# Altium integrated library Lattice CPLD ispLSI.IntLib: 471 symbols (part 2 of 26)
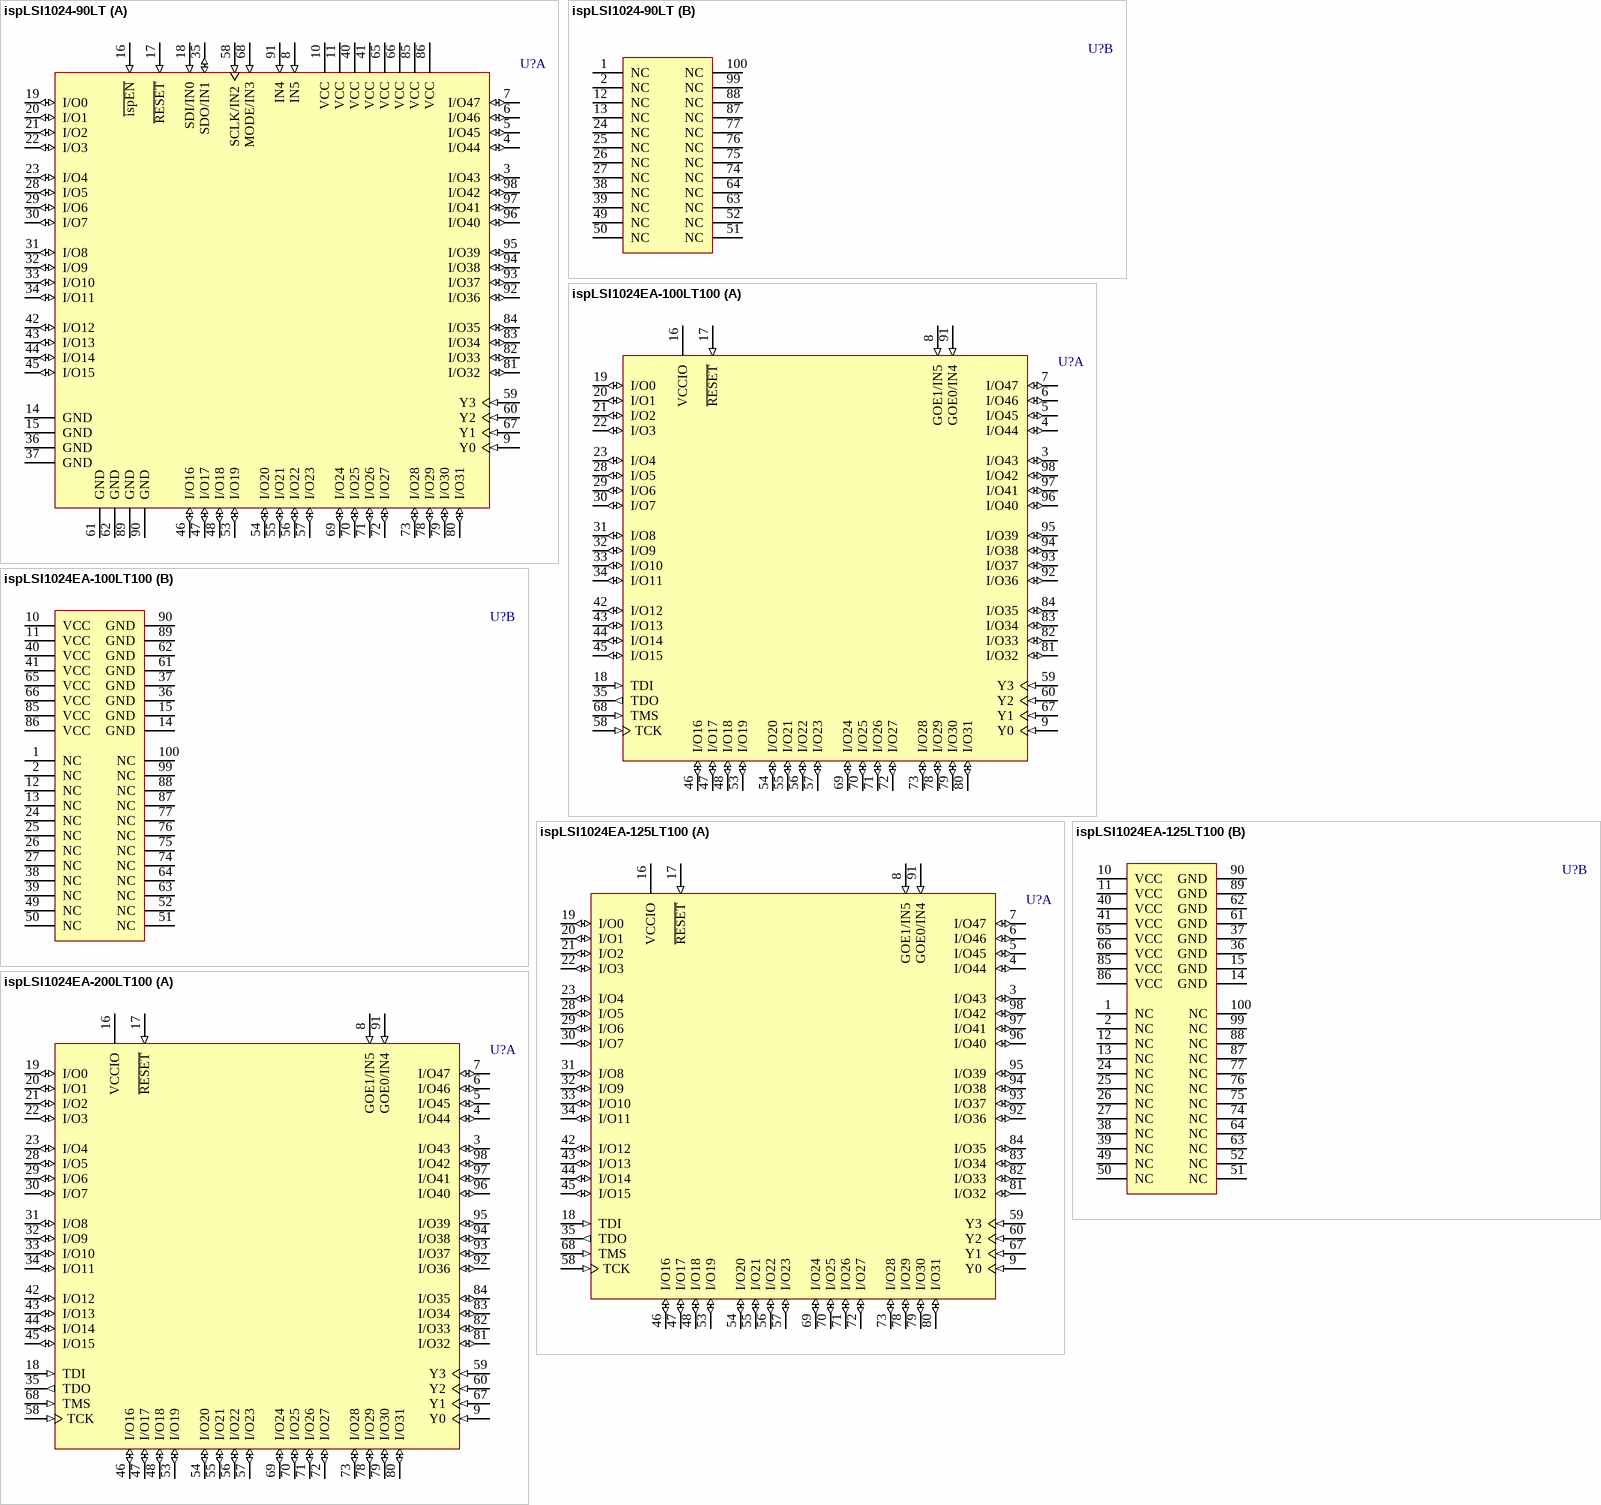
[diagram p232: symbols ispLSI1024-90LT to ispLSI1024EA-200LT100]

## ispLSI1024EA-100LT100
designator U?
In-System Programmable High-Density PLD; Note: Pins 8 and 91 have dual function capability which is software selectable.; Published: 23-Sep-2002; LatestRevisionDate: 13-Apr-2006; LatestRevisionNote: IPC-7351 Footprint Added.; DatasheetVersion: Jun-2000; PackageVersion: pkg_32, Aug-2005; PackageReference: TQFP100; Publisher: Altium Limited; PackageDescription: 100-Pin Thin Quad Flat Pack (TQFP100); Code_JEDEC: MS-026-BED; ComponentLink1Description: Manufacturer Link; ComponentLink1URL: http://www.latticesemi.com/products/mature/index.cfm; ComponentLink2Description: Datasheet; ComponentLink2URL: http://www.latticesemi.com/lit/docs/datasheets/cpld/1024ea.pdf
footprint TQFP100_N (Thin QFP, 100-Leads, Body 14x14mm, Pitch 0.5mm, IPC Medium Density)
footprint TQFP100_L (Thin QFP, 100-Leads, Body 14x14mm, Pitch 0.5mm, IPC High Density)
footprint TQFP100_M (Thin QFP, 100-Leads, Body 14x14mm, Pitch 0.5mm, IPC Low Density)
3D model 1024EA-TQFP100 (100-Pin Thin Quad Flat Pack (TQFP100))
part A pins: 3 I/O43 (io), 4 I/O44 (io), 5 I/O45 (io), 6 I/O46 (io), 7 I/O47 (io), 8 GOE1/IN5 (in), 9 Y0 (in), 16 VCCIO (power), 17 ~{RESET} (in), 18 TDI (in), 19 I/O0 (io), 20 I/O1 (io), 21 I/O2 (io), 22 I/O3 (io), 23 I/O4 (io), 28 I/O5 (io), 29 I/O6 (io), 30 I/O7 (io), 31 I/O8 (io), 32 I/O9 (io), 33 I/O10 (io), 34 I/O11 (io), 35 TDO (out), 42 I/O12 (io), 43 I/O13 (io), 44 I/O14 (io), 45 I/O15 (io), 46 I/O16 (io), 47 I/O17 (io), 48 I/O18 (io), 53 I/O19 (io), 54 I/O20 (io), 55 I/O21 (io), 56 I/O22 (io), 57 I/O23 (io), 58 TCK (in), 59 Y3 (in), 60 Y2 (in), 67 Y1 (in), 68 TMS (in), 69 I/O24 (io), 70 I/O25 (io), 71 I/O26 (io), 72 I/O27 (io), 73 I/O28 (io), 78 I/O29 (io), 79 I/O30 (io), 80 I/O31 (io), 81 I/O32 (io), 82 I/O33 (io), 83 I/O34 (io), 84 I/O35 (io), 91 GOE0/IN4 (in), 92 I/O36 (io), 93 I/O37 (io), 94 I/O38 (io), 95 I/O39 (io), 96 I/O40 (io), 97 I/O41 (io), 98 I/O42 (io)
part B pins: 1 NC, 2 NC, 10 VCC (power), 11 VCC (power), 12 NC, 13 NC, 14 GND (power), 15 GND (power), 24 NC, 25 NC, 26 NC, 27 NC, 36 GND (power), 37 GND (power), 38 NC, 39 NC, 40 VCC (power), 41 VCC (power), 49 NC, 50 NC, 51 NC, 52 NC, 61 GND (power), 62 GND (power), 63 NC, 64 NC, 65 VCC (power), 66 VCC (power), 74 NC, 75 NC, 76 NC, 77 NC, 85 VCC (power), 86 VCC (power), 87 NC, 88 NC, 89 GND (power), 90 GND (power), 99 NC, 100 NC

## ispLSI1024EA-125LT100
designator U?
In-System Programmable High-Density PLD; Note: Pins 8 and 91 have dual function capability which is software selectable.; Published: 23-Sep-2002; LatestRevisionDate: 13-Apr-2006; LatestRevisionNote: IPC-7351 Footprint Added.; DatasheetVersion: Jun-2000; PackageVersion: pkg_32, Aug-2005; PackageReference: TQFP100; Publisher: Altium Limited; PackageDescription: 100-Pin Thin Quad Flat Pack (TQFP100); Code_JEDEC: MS-026-BED; ComponentLink1Description: Manufacturer Link; ComponentLink1URL: http://www.latticesemi.com/products/mature/index.cfm; ComponentLink2Description: Datasheet; ComponentLink2URL: http://www.latticesemi.com/lit/docs/datasheets/cpld/1024ea.pdf
footprint TQFP100_N (Thin QFP, 100-Leads, Body 14x14mm, Pitch 0.5mm, IPC Medium Density)
footprint TQFP100_L (Thin QFP, 100-Leads, Body 14x14mm, Pitch 0.5mm, IPC High Density)
footprint TQFP100_M (Thin QFP, 100-Leads, Body 14x14mm, Pitch 0.5mm, IPC Low Density)
3D model 1024EA-TQFP100 (100-Pin Thin Quad Flat Pack (TQFP100))
part A pins: 3 I/O43 (io), 4 I/O44 (io), 5 I/O45 (io), 6 I/O46 (io), 7 I/O47 (io), 8 GOE1/IN5 (in), 9 Y0 (in), 16 VCCIO (power), 17 ~{RESET} (in), 18 TDI (in), 19 I/O0 (io), 20 I/O1 (io), 21 I/O2 (io), 22 I/O3 (io), 23 I/O4 (io), 28 I/O5 (io), 29 I/O6 (io), 30 I/O7 (io), 31 I/O8 (io), 32 I/O9 (io), 33 I/O10 (io), 34 I/O11 (io), 35 TDO (out), 42 I/O12 (io), 43 I/O13 (io), 44 I/O14 (io), 45 I/O15 (io), 46 I/O16 (io), 47 I/O17 (io), 48 I/O18 (io), 53 I/O19 (io), 54 I/O20 (io), 55 I/O21 (io), 56 I/O22 (io), 57 I/O23 (io), 58 TCK (in), 59 Y3 (in), 60 Y2 (in), 67 Y1 (in), 68 TMS (in), 69 I/O24 (io), 70 I/O25 (io), 71 I/O26 (io), 72 I/O27 (io), 73 I/O28 (io), 78 I/O29 (io), 79 I/O30 (io), 80 I/O31 (io), 81 I/O32 (io), 82 I/O33 (io), 83 I/O34 (io), 84 I/O35 (io), 91 GOE0/IN4 (in), 92 I/O36 (io), 93 I/O37 (io), 94 I/O38 (io), 95 I/O39 (io), 96 I/O40 (io), 97 I/O41 (io), 98 I/O42 (io)
part B pins: 1 NC, 2 NC, 10 VCC (power), 11 VCC (power), 12 NC, 13 NC, 14 GND (power), 15 GND (power), 24 NC, 25 NC, 26 NC, 27 NC, 36 GND (power), 37 GND (power), 38 NC, 39 NC, 40 VCC (power), 41 VCC (power), 49 NC, 50 NC, 51 NC, 52 NC, 61 GND (power), 62 GND (power), 63 NC, 64 NC, 65 VCC (power), 66 VCC (power), 74 NC, 75 NC, 76 NC, 77 NC, 85 VCC (power), 86 VCC (power), 87 NC, 88 NC, 89 GND (power), 90 GND (power), 99 NC, 100 NC

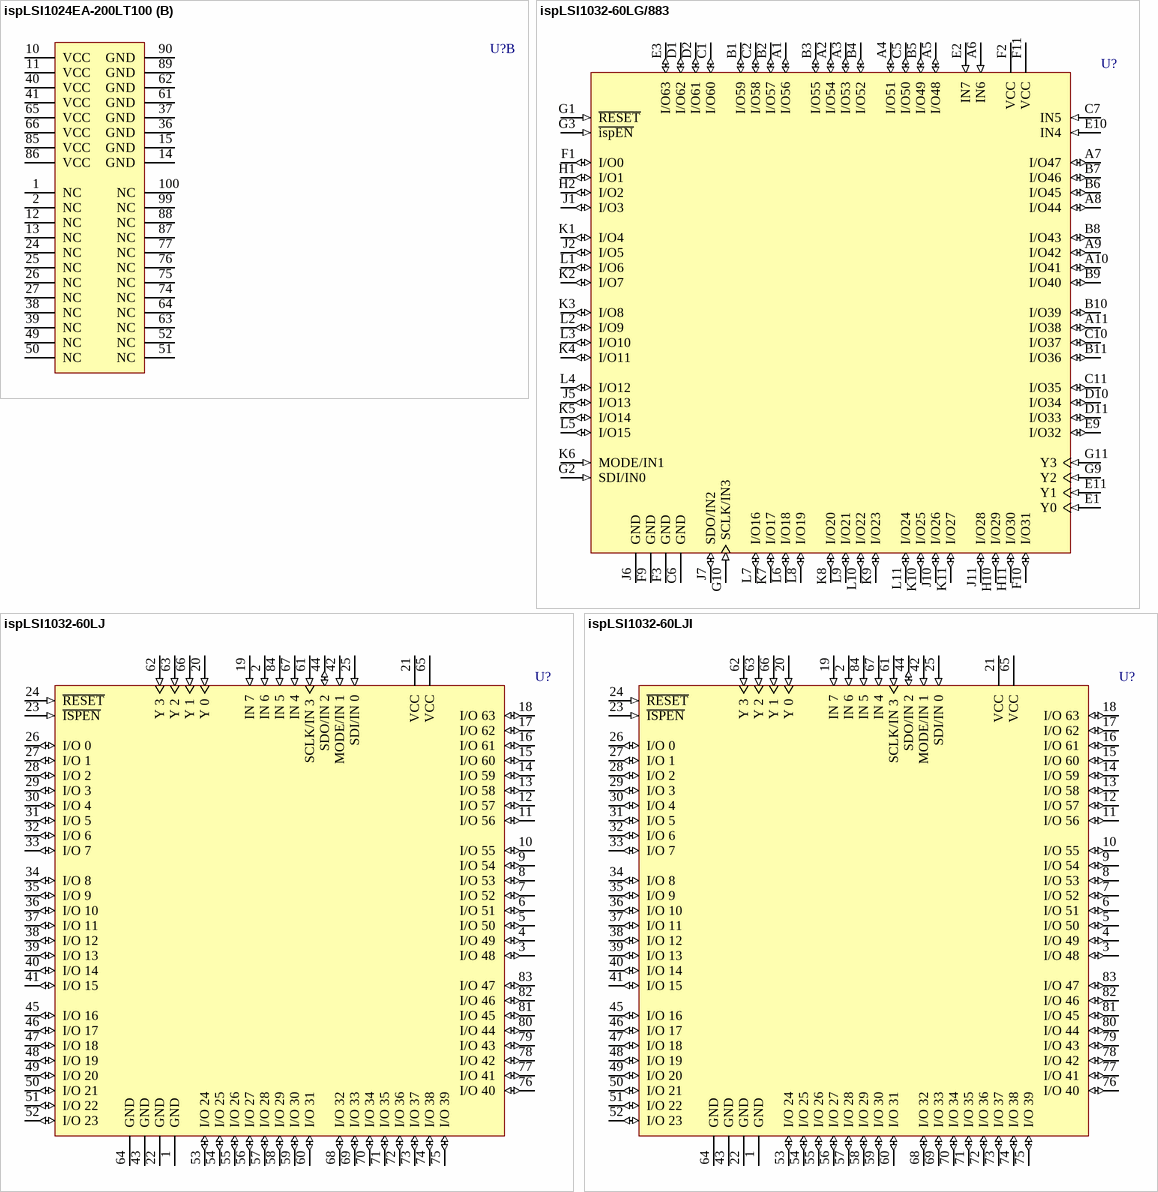
[diagram p6: symbols ispLSI1024EA-200LT100 to ispLSI1032-60LJI]

## ispLSI1024EA-200LT100
designator U?
In-System Programmable High-Density PLD; Note: Pins 8 and 91 have dual function capability which is software selectable.; Published: 23-Sep-2002; LatestRevisionDate: 13-Apr-2006; LatestRevisionNote: IPC-7351 Footprint Added.; DatasheetVersion: Jun-2000; PackageVersion: pkg_32, Aug-2005; PackageReference: TQFP100; Publisher: Altium Limited; PackageDescription: 100-Pin Thin Quad Flat Pack (TQFP100); Code_JEDEC: MS-026-BED; ComponentLink1Description: Manufacturer Link; ComponentLink1URL: http://www.latticesemi.com/products/mature/index.cfm; ComponentLink2Description: Datasheet; ComponentLink2URL: http://www.latticesemi.com/lit/docs/datasheets/cpld/1024ea.pdf
footprint TQFP100_N (Thin QFP, 100-Leads, Body 14x14mm, Pitch 0.5mm, IPC Medium Density)
footprint TQFP100_L (Thin QFP, 100-Leads, Body 14x14mm, Pitch 0.5mm, IPC High Density)
footprint TQFP100_M (Thin QFP, 100-Leads, Body 14x14mm, Pitch 0.5mm, IPC Low Density)
3D model 1024EA-TQFP100 (100-Pin Thin Quad Flat Pack (TQFP100))
part A pins: 3 I/O43 (io), 4 I/O44 (io), 5 I/O45 (io), 6 I/O46 (io), 7 I/O47 (io), 8 GOE1/IN5 (in), 9 Y0 (in), 16 VCCIO (power), 17 ~{RESET} (in), 18 TDI (in), 19 I/O0 (io), 20 I/O1 (io), 21 I/O2 (io), 22 I/O3 (io), 23 I/O4 (io), 28 I/O5 (io), 29 I/O6 (io), 30 I/O7 (io), 31 I/O8 (io), 32 I/O9 (io), 33 I/O10 (io), 34 I/O11 (io), 35 TDO (out), 42 I/O12 (io), 43 I/O13 (io), 44 I/O14 (io), 45 I/O15 (io), 46 I/O16 (io), 47 I/O17 (io), 48 I/O18 (io), 53 I/O19 (io), 54 I/O20 (io), 55 I/O21 (io), 56 I/O22 (io), 57 I/O23 (io), 58 TCK (in), 59 Y3 (in), 60 Y2 (in), 67 Y1 (in), 68 TMS (in), 69 I/O24 (io), 70 I/O25 (io), 71 I/O26 (io), 72 I/O27 (io), 73 I/O28 (io), 78 I/O29 (io), 79 I/O30 (io), 80 I/O31 (io), 81 I/O32 (io), 82 I/O33 (io), 83 I/O34 (io), 84 I/O35 (io), 91 GOE0/IN4 (in), 92 I/O36 (io), 93 I/O37 (io), 94 I/O38 (io), 95 I/O39 (io), 96 I/O40 (io), 97 I/O41 (io), 98 I/O42 (io)
part B pins: 1 NC, 2 NC, 10 VCC (power), 11 VCC (power), 12 NC, 13 NC, 14 GND (power), 15 GND (power), 24 NC, 25 NC, 26 NC, 27 NC, 36 GND (power), 37 GND (power), 38 NC, 39 NC, 40 VCC (power), 41 VCC (power), 49 NC, 50 NC, 51 NC, 52 NC, 61 GND (power), 62 GND (power), 63 NC, 64 NC, 65 VCC (power), 66 VCC (power), 74 NC, 75 NC, 76 NC, 77 NC, 85 VCC (power), 86 VCC (power), 87 NC, 88 NC, 89 GND (power), 90 GND (power), 99 NC, 100 NC

## ispLSI1032-60LG/883
designator U?
In-System Programmable High-Density PLD; Note: Pins G2, K6, J7 and G10 have dual function capability.; Published: 23-Sep-2002; LatestRevisionDate: 04-Mar-2005; LatestRevisionNote: Stylized 3D Model Added.; DatasheetVersion: Mar-1999; PackageVersion: pkg_32, Aug-2005; PackageReference: CPGA84; Publisher: Altium Limited; PackageDescription: 85-Pin Pin Grid Array 2.54 mm Pitch; ComponentLink1Description: Manufacturer Link; ComponentLink1URL: http://www.latticesemi.com/products/mature/index.cfm; ComponentLink2Description: Datasheet; ComponentLink2URL: http://www.latticesemi.com/lit/docs/datasheets/cpld/1032.pdf
footprint CPGA84 (PGA, 85-Leads, Body 29.5x29.5mm, Pitch 2.54mm)
3D model 1032-CPGA84 (85-Pin Pin Grid Array 2.54 mm Pitch)
pins: A1 I/O56 (io), A2 I/O54 (io), A3 I/O53 (io), A4 I/O51 (io), A5 I/O48 (io), A6 IN6 (in), A7 I/O47 (io), A8 I/O44 (io), A9 I/O42 (io), A10 I/O41 (io), A11 I/O38 (io), B1 I/O59 (io), B2 I/O57 (io), B3 I/O55 (io), B4 I/O52 (io), B5 I/O49 (io), B6 I/O45 (io), B7 I/O46 (io), B8 I/O43 (io), B9 I/O40 (io), B10 I/O39 (io), B11 I/O36 (io), C1 I/O60 (io), C2 I/O58 (io), C5 I/O50 (io), C6 GND (power), C7 IN5 (in), C10 I/O37 (io), C11 I/O35 (io), D1 I/O62 (io), D2 I/O61 (io), D10 I/O34 (io), D11 I/O33 (io), E1 Y0 (in), E2 IN7 (in), E3 I/O63 (io), E9 I/O32 (io), E10 IN4 (in), E11 Y1 (in), F1 I/O0 (io), F2 VCC (power), F3 GND (power), F9 GND (power), F10 I/O31 (io), F11 VCC (power), G1 ~{RESET} (in), G2 SDI/IN0 (in), G3 ~{ispEN} (in), G9 Y2 (in), G10 SCLK/IN3 (in), G11 Y3 (in), H1 I/O1 (io), H2 I/O2 (io), H10 I/O29 (io), H11 I/O30 (io), J1 I/O3 (io), J2 I/O5 (io), J5 I/O13 (io), J6 GND (power), J7 SDO/IN2 (io), J10 I/O26 (io), J11 I/O28 (io), K1 I/O4 (io), K2 I/O7 (io), K3 I/O8 (io), K4 I/O11 (io), K5 I/O14 (io), K6 MODE/IN1 (in), K7 I/O17 (io), K8 I/O20 (io), K9 I/O23 (io), K10 I/O25 (io), K11 I/O27 (io), L1 I/O6 (io), L2 I/O9 (io), L3 I/O10 (io), L4 I/O12 (io), L5 I/O15 (io), L6 I/O18 (io), L7 I/O16 (io), L8 I/O19 (io), L9 I/O21 (io), L10 I/O22 (io), L11 I/O24 (io)

## ispLSI1032-60LJ
designator U?
High-Density Programmable Logic; Published: 8-Jun-2000; LatestRevisionDate: 13-Apr-2006; LatestRevisionNote: IPC-7351 Footprint Added.; DatasheetVersion: 1994; PackageVersion: pkg_32, Aug-2005; PackageReference: PLCC84; Publisher: Altium Limited; PackageDescription: 84-Pin Leaded Chip Carrier 1.27 mm Pitch; Code_IPC: PLCC-84; ComponentLink1Description: Manufacturer Link; ComponentLink1URL: http://www.latticesemi.com/products/mature/index.cfm; ComponentLink2Description: Datasheet; ComponentLink2URL: http://www.latticesemi.com/lit/docs/datasheets/cpld/1032.pdf
footprint PLCC84_N (Leaded Chip Carrier, 84-Leads, Body 29.3x29.3mm, Pitch 1.27mm, IPC Medium Density)
footprint PLCC84_L (Leaded Chip Carrier, 84-Leads, Body 29.3x29.3mm, Pitch 1.27mm, IPC High Density)
footprint PLCC84_M (Leaded Chip Carrier, 84-Leads, Body 29.3x29.3mm, Pitch 1.27mm, IPC Low Density)
3D model 1032-PLCC84 (84-Pin Leaded Chip Carrier 1.27 mm Pitch)
pins: 1 GND (power), 2 IN 6 (in), 3 I/O 48 (io), 4 I/O 49 (io), 5 I/O 50 (io), 6 I/O 51 (io), 7 I/O 52 (io), 8 I/O 53 (io), 9 I/O 54 (io), 10 I/O 55 (io), 11 I/O 56 (io), 12 I/O 57 (io), 13 I/O 58 (io), 14 I/O 59 (io), 15 I/O 60 (io), 16 I/O 61 (io), 17 I/O 62 (io), 18 I/O 63 (io), 19 IN 7 (in), 20 Y 0 (in), 21 VCC (power), 22 GND (power), 23 ~{ISPEN} (in), 24 ~{RESET} (in), 25 SDI/IN 0 (in), 26 I/O 0 (io), 27 I/O 1 (io), 28 I/O 2 (io), 29 I/O 3 (io), 30 I/O 4 (io), 31 I/O 5 (io), 32 I/O 6 (io), 33 I/O 7 (io), 34 I/O 8 (io), 35 I/O 9 (io), 36 I/O 10 (io), 37 I/O 11 (io), 38 I/O 12 (io), 39 I/O 13 (io), 40 I/O 14 (io), 41 I/O 15 (io), 42 MODE/IN 1 (in), 43 GND (power), 44 SDO/IN 2 (io), 45 I/O 16 (io), 46 I/O 17 (io), 47 I/O 18 (io), 48 I/O 19 (io), 49 I/O 20 (io), 50 I/O 21 (io), 51 I/O 22 (io), 52 I/O 23 (io), 53 I/O 24 (io), 54 I/O 25 (io), 55 I/O 26 (io), 56 I/O 27 (io), 57 I/O 28 (io), 58 I/O 29 (io), 59 I/O 30 (io), 60 I/O 31 (io), 61 SCLK/IN 3 (in), 62 Y 3 (in), 63 Y 2 (in), 64 GND (power), 65 VCC (power), 66 Y 1 (in), 67 IN 4 (in), 68 I/O 32 (io), 69 I/O 33 (io), 70 I/O 34 (io), 71 I/O 35 (io), 72 I/O 36 (io), 73 I/O 37 (io), 74 I/O 38 (io), 75 I/O 39 (io), 76 I/O 40 (io), 77 I/O 41 (io), 78 I/O 42 (io), 79 I/O 43 (io), 80 I/O 44 (io), 81 I/O 45 (io), 82 I/O 46 (io), 83 I/O 47 (io), 84 IN 5 (in)

## ispLSI1032-60LJI
designator U?
High-Density Programmable Logic; Published: 8-Jun-2000; LatestRevisionDate: 13-Apr-2006; LatestRevisionNote: IPC-7351 Footprint Added.; DatasheetVersion: 1994; PackageVersion: pkg_32, Aug-2005; PackageReference: PLCC84; Publisher: Altium Limited; PackageDescription: 84-Pin Leaded Chip Carrier 1.27 mm Pitch; Code_IPC: PLCC-84; ComponentLink1Description: Manufacturer Link; ComponentLink1URL: http://www.latticesemi.com/products/mature/index.cfm; ComponentLink2Description: Datasheet; ComponentLink2URL: http://www.latticesemi.com/lit/docs/datasheets/cpld/1032.pdf
footprint PLCC84_N (Leaded Chip Carrier, 84-Leads, Body 29.3x29.3mm, Pitch 1.27mm, IPC Medium Density)
footprint PLCC84_L (Leaded Chip Carrier, 84-Leads, Body 29.3x29.3mm, Pitch 1.27mm, IPC High Density)
footprint PLCC84_M (Leaded Chip Carrier, 84-Leads, Body 29.3x29.3mm, Pitch 1.27mm, IPC Low Density)
3D model 1032-PLCC84 (84-Pin Leaded Chip Carrier 1.27 mm Pitch)
pins: 1 GND (power), 2 IN 6 (in), 3 I/O 48 (io), 4 I/O 49 (io), 5 I/O 50 (io), 6 I/O 51 (io), 7 I/O 52 (io), 8 I/O 53 (io), 9 I/O 54 (io), 10 I/O 55 (io), 11 I/O 56 (io), 12 I/O 57 (io), 13 I/O 58 (io), 14 I/O 59 (io), 15 I/O 60 (io), 16 I/O 61 (io), 17 I/O 62 (io), 18 I/O 63 (io), 19 IN 7 (in), 20 Y 0 (in), 21 VCC (power), 22 GND (power), 23 ~{ISPEN} (in), 24 ~{RESET} (in), 25 SDI/IN 0 (in), 26 I/O 0 (io), 27 I/O 1 (io), 28 I/O 2 (io), 29 I/O 3 (io), 30 I/O 4 (io), 31 I/O 5 (io), 32 I/O 6 (io), 33 I/O 7 (io), 34 I/O 8 (io), 35 I/O 9 (io), 36 I/O 10 (io), 37 I/O 11 (io), 38 I/O 12 (io), 39 I/O 13 (io), 40 I/O 14 (io), 41 I/O 15 (io), 42 MODE/IN 1 (in), 43 GND (power), 44 SDO/IN 2 (io), 45 I/O 16 (io), 46 I/O 17 (io), 47 I/O 18 (io), 48 I/O 19 (io), 49 I/O 20 (io), 50 I/O 21 (io), 51 I/O 22 (io), 52 I/O 23 (io), 53 I/O 24 (io), 54 I/O 25 (io), 55 I/O 26 (io), 56 I/O 27 (io), 57 I/O 28 (io), 58 I/O 29 (io), 59 I/O 30 (io), 60 I/O 31 (io), 61 SCLK/IN 3 (in), 62 Y 3 (in), 63 Y 2 (in), 64 GND (power), 65 VCC (power), 66 Y 1 (in), 67 IN 4 (in), 68 I/O 32 (io), 69 I/O 33 (io), 70 I/O 34 (io), 71 I/O 35 (io), 72 I/O 36 (io), 73 I/O 37 (io), 74 I/O 38 (io), 75 I/O 39 (io), 76 I/O 40 (io), 77 I/O 41 (io), 78 I/O 42 (io), 79 I/O 43 (io), 80 I/O 44 (io), 81 I/O 45 (io), 82 I/O 46 (io), 83 I/O 47 (io), 84 IN 5 (in)

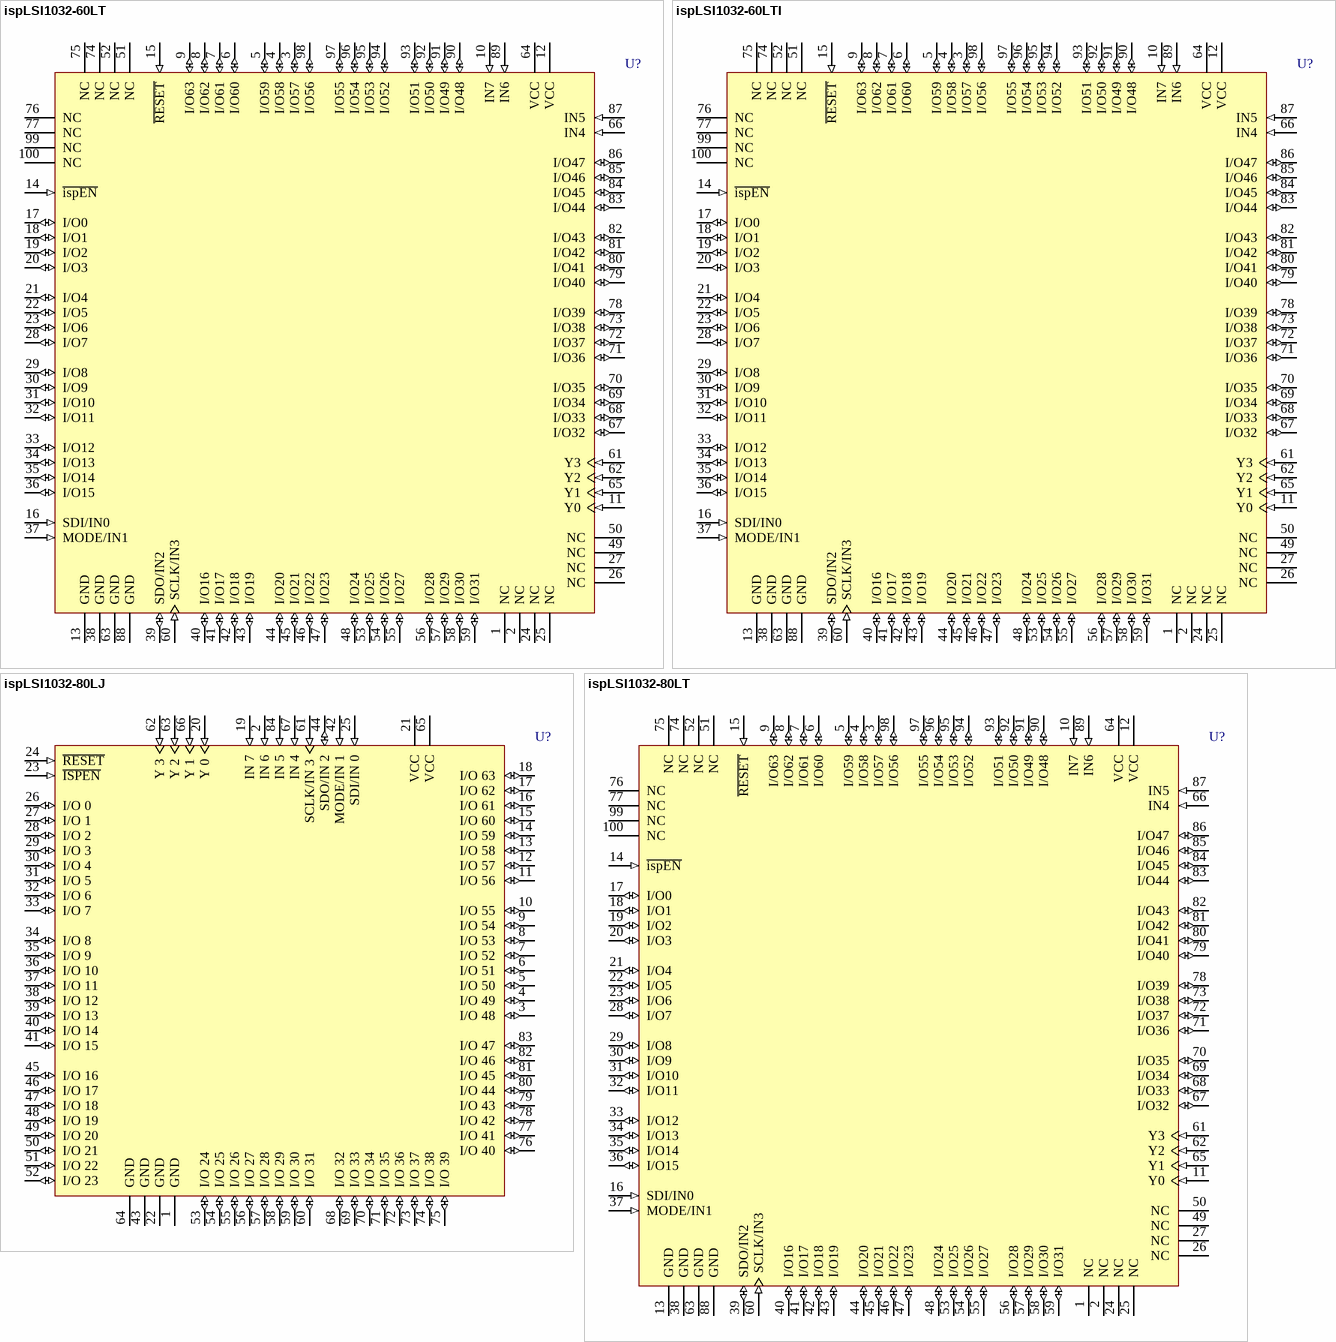
[diagram p7: symbols ispLSI1032-60LT to ispLSI1032-80LT]

## ispLSI1032-60LT
designator U?
High-Density Programmable Logic; Note: Pins 1, 2, 24-27, 49-52, 74-77, 99 and 100 are No internal Connection (NC) pins.; Published: 8-Jun-2000; LatestRevisionDate: 13-Apr-2006; LatestRevisionNote: IPC-7351 Footprint Added.; DatasheetVersion: 1994; PackageVersion: pkg_32, Aug-2005; PackageReference: TQFP100; Publisher: Altium Limited; PackageDescription: 100-Pin Thin Quad Flat Pack (TQFP100); Code_JEDEC: MS-026-BED; ComponentLink1Description: Manufacturer Link; ComponentLink1URL: http://www.latticesemi.com/products/mature/index.cfm; ComponentLink2Description: Datasheet; ComponentLink2URL: http://www.latticesemi.com/lit/docs/datasheets/cpld/1032.pdf
footprint TQFP100_N (Thin QFP, 100-Leads, Body 14x14mm, Pitch 0.5mm, IPC Medium Density)
footprint TQFP100_L (Thin QFP, 100-Leads, Body 14x14mm, Pitch 0.5mm, IPC High Density)
footprint TQFP100_M (Thin QFP, 100-Leads, Body 14x14mm, Pitch 0.5mm, IPC Low Density)
3D model 1032-TQFP100 (100-Pin Thin Quad Flat Pack (TQFP100))
pins: 1 NC, 2 NC, 3 I/O57 (io), 4 I/O58 (io), 5 I/O59 (io), 6 I/O60 (io), 7 I/O61 (io), 8 I/O62 (io), 9 I/O63 (io), 10 IN7 (in), 11 Y0 (in), 12 VCC (power), 13 GND (power), 14 ~{ispEN} (in), 15 ~{RESET} (in), 16 SDI/IN0 (in), 17 I/O0 (io), 18 I/O1 (io), 19 I/O2 (io), 20 I/O3 (io), 21 I/O4 (io), 22 I/O5 (io), 23 I/O6 (io), 24 NC, 25 NC, 26 NC, 27 NC, 28 I/O7 (io), 29 I/O8 (io), 30 I/O9 (io), 31 I/O10 (io), 32 I/O11 (io), 33 I/O12 (io), 34 I/O13 (io), 35 I/O14 (io), 36 I/O15 (io), 37 MODE/IN1 (in), 38 GND (power), 39 SDO/IN2 (io), 40 I/O16 (io), 41 I/O17 (io), 42 I/O18 (io), 43 I/O19 (io), 44 I/O20 (io), 45 I/O21 (io), 46 I/O22 (io), 47 I/O23 (io), 48 I/O24 (io), 49 NC, 50 NC, 51 NC, 52 NC, 53 I/O25 (io), 54 I/O26 (io), 55 I/O27 (io), 56 I/O28 (io), 57 I/O29 (io), 58 I/O30 (io), 59 I/O31 (io), 60 SCLK/IN3 (in), 61 Y3 (in), 62 Y2 (in), 63 GND (power), 64 VCC (power), 65 Y1 (in), 66 IN4 (in), 67 I/O32 (io), 68 I/O33 (io), 69 I/O34 (io), 70 I/O35 (io), 71 I/O36 (io), 72 I/O37 (io), 73 I/O38 (io), 74 NC, 75 NC, 76 NC, 77 NC, 78 I/O39 (io), 79 I/O40 (io), 80 I/O41 (io), 81 I/O42 (io), 82 I/O43 (io), 83 I/O44 (io), 84 I/O45 (io), 85 I/O46 (io), 86 I/O47 (io), 87 IN5 (in), 88 GND (power), 89 IN6 (in), 90 I/O48 (io), 91 I/O49 (io), 92 I/O50 (io), 93 I/O51 (io), 94 I/O52 (io), 95 I/O53 (io), 96 I/O54 (io), 97 I/O55 (io), 98 I/O56 (io), 99 NC, 100 NC

## ispLSI1032-60LTI
designator U?
In-System Programmable High-Density PLD; Note: Pins 16, 37, 39 and 60 have dual function capability.; Published: 23-Sep-2002; LatestRevisionDate: 13-Apr-2006; LatestRevisionNote: IPC-7351 Footprint Added.; DatasheetVersion: Mar-1999; PackageVersion: pkg_32, Aug-2005; PackageReference: TQFP100; Publisher: Altium Limited; PackageDescription: 100-Pin Thin Quad Flat Pack (TQFP100); Code_JEDEC: MS-026-BED; ComponentLink1Description: Manufacturer Link; ComponentLink1URL: http://www.latticesemi.com/products/mature/index.cfm; ComponentLink2Description: Datasheet; ComponentLink2URL: http://www.latticesemi.com/lit/docs/datasheets/cpld/1032.pdf
footprint TQFP100_N (Thin QFP, 100-Leads, Body 14x14mm, Pitch 0.5mm, IPC Medium Density)
footprint TQFP100_L (Thin QFP, 100-Leads, Body 14x14mm, Pitch 0.5mm, IPC High Density)
footprint TQFP100_M (Thin QFP, 100-Leads, Body 14x14mm, Pitch 0.5mm, IPC Low Density)
3D model 1032-TQFP100 (100-Pin Thin Quad Flat Pack (TQFP100))
pins: 1 NC, 2 NC, 3 I/O57 (io), 4 I/O58 (io), 5 I/O59 (io), 6 I/O60 (io), 7 I/O61 (io), 8 I/O62 (io), 9 I/O63 (io), 10 IN7 (in), 11 Y0 (in), 12 VCC (power), 13 GND (power), 14 ~{ispEN} (in), 15 ~{RESET} (in), 16 SDI/IN0 (in), 17 I/O0 (io), 18 I/O1 (io), 19 I/O2 (io), 20 I/O3 (io), 21 I/O4 (io), 22 I/O5 (io), 23 I/O6 (io), 24 NC, 25 NC, 26 NC, 27 NC, 28 I/O7 (io), 29 I/O8 (io), 30 I/O9 (io), 31 I/O10 (io), 32 I/O11 (io), 33 I/O12 (io), 34 I/O13 (io), 35 I/O14 (io), 36 I/O15 (io), 37 MODE/IN1 (in), 38 GND (power), 39 SDO/IN2 (io), 40 I/O16 (io), 41 I/O17 (io), 42 I/O18 (io), 43 I/O19 (io), 44 I/O20 (io), 45 I/O21 (io), 46 I/O22 (io), 47 I/O23 (io), 48 I/O24 (io), 49 NC, 50 NC, 51 NC, 52 NC, 53 I/O25 (io), 54 I/O26 (io), 55 I/O27 (io), 56 I/O28 (io), 57 I/O29 (io), 58 I/O30 (io), 59 I/O31 (io), 60 SCLK/IN3 (in), 61 Y3 (in), 62 Y2 (in), 63 GND (power), 64 VCC (power), 65 Y1 (in), 66 IN4 (in), 67 I/O32 (io), 68 I/O33 (io), 69 I/O34 (io), 70 I/O35 (io), 71 I/O36 (io), 72 I/O37 (io), 73 I/O38 (io), 74 NC, 75 NC, 76 NC, 77 NC, 78 I/O39 (io), 79 I/O40 (io), 80 I/O41 (io), 81 I/O42 (io), 82 I/O43 (io), 83 I/O44 (io), 84 I/O45 (io), 85 I/O46 (io), 86 I/O47 (io), 87 IN5 (in), 88 GND (power), 89 IN6 (in), 90 I/O48 (io), 91 I/O49 (io), 92 I/O50 (io), 93 I/O51 (io), 94 I/O52 (io), 95 I/O53 (io), 96 I/O54 (io), 97 I/O55 (io), 98 I/O56 (io), 99 NC, 100 NC

## ispLSI1032-80LJ
designator U?
High-Density Programmable Logic; Published: 8-Jun-2000; LatestRevisionDate: 13-Apr-2006; LatestRevisionNote: IPC-7351 Footprint Added.; DatasheetVersion: 1994; PackageVersion: pkg_32, Aug-2005; PackageReference: PLCC84; Publisher: Altium Limited; PackageDescription: 84-Pin Leaded Chip Carrier 1.27 mm Pitch; Code_IPC: PLCC-84; ComponentLink1Description: Manufacturer Link; ComponentLink1URL: http://www.latticesemi.com/products/mature/index.cfm; ComponentLink2Description: Datasheet; ComponentLink2URL: http://www.latticesemi.com/lit/docs/datasheets/cpld/1032.pdf
footprint PLCC84_N (Leaded Chip Carrier, 84-Leads, Body 29.3x29.3mm, Pitch 1.27mm, IPC Medium Density)
footprint PLCC84_L (Leaded Chip Carrier, 84-Leads, Body 29.3x29.3mm, Pitch 1.27mm, IPC High Density)
footprint PLCC84_M (Leaded Chip Carrier, 84-Leads, Body 29.3x29.3mm, Pitch 1.27mm, IPC Low Density)
3D model 1032-PLCC84 (84-Pin Leaded Chip Carrier 1.27 mm Pitch)
pins: 1 GND (power), 2 IN 6 (in), 3 I/O 48 (io), 4 I/O 49 (io), 5 I/O 50 (io), 6 I/O 51 (io), 7 I/O 52 (io), 8 I/O 53 (io), 9 I/O 54 (io), 10 I/O 55 (io), 11 I/O 56 (io), 12 I/O 57 (io), 13 I/O 58 (io), 14 I/O 59 (io), 15 I/O 60 (io), 16 I/O 61 (io), 17 I/O 62 (io), 18 I/O 63 (io), 19 IN 7 (in), 20 Y 0 (in), 21 VCC (power), 22 GND (power), 23 ~{ISPEN} (in), 24 ~{RESET} (in), 25 SDI/IN 0 (in), 26 I/O 0 (io), 27 I/O 1 (io), 28 I/O 2 (io), 29 I/O 3 (io), 30 I/O 4 (io), 31 I/O 5 (io), 32 I/O 6 (io), 33 I/O 7 (io), 34 I/O 8 (io), 35 I/O 9 (io), 36 I/O 10 (io), 37 I/O 11 (io), 38 I/O 12 (io), 39 I/O 13 (io), 40 I/O 14 (io), 41 I/O 15 (io), 42 MODE/IN 1 (in), 43 GND (power), 44 SDO/IN 2 (io), 45 I/O 16 (io), 46 I/O 17 (io), 47 I/O 18 (io), 48 I/O 19 (io), 49 I/O 20 (io), 50 I/O 21 (io), 51 I/O 22 (io), 52 I/O 23 (io), 53 I/O 24 (io), 54 I/O 25 (io), 55 I/O 26 (io), 56 I/O 27 (io), 57 I/O 28 (io), 58 I/O 29 (io), 59 I/O 30 (io), 60 I/O 31 (io), 61 SCLK/IN 3 (in), 62 Y 3 (in), 63 Y 2 (in), 64 GND (power), 65 VCC (power), 66 Y 1 (in), 67 IN 4 (in), 68 I/O 32 (io), 69 I/O 33 (io), 70 I/O 34 (io), 71 I/O 35 (io), 72 I/O 36 (io), 73 I/O 37 (io), 74 I/O 38 (io), 75 I/O 39 (io), 76 I/O 40 (io), 77 I/O 41 (io), 78 I/O 42 (io), 79 I/O 43 (io), 80 I/O 44 (io), 81 I/O 45 (io), 82 I/O 46 (io), 83 I/O 47 (io), 84 IN 5 (in)

## ispLSI1032-80LT
designator U?
High-Density Programmable Logic; Note: Pins 1, 2, 24-27, 49-52, 74-77, 99 and 100 are No internal Connection (NC) pins.; Published: 8-Jun-2000; LatestRevisionDate: 13-Apr-2006; LatestRevisionNote: IPC-7351 Footprint Added.; DatasheetVersion: 1994; PackageVersion: pkg_32, Aug-2005; PackageReference: TQFP100; Publisher: Altium Limited; PackageDescription: 100-Pin Thin Quad Flat Pack (TQFP100); Code_JEDEC: MS-026-BED; ComponentLink1Description: Manufacturer Link; ComponentLink1URL: http://www.latticesemi.com/products/mature/index.cfm; ComponentLink2Description: Datasheet; ComponentLink2URL: http://www.latticesemi.com/lit/docs/datasheets/cpld/1032.pdf
footprint TQFP100_N (Thin QFP, 100-Leads, Body 14x14mm, Pitch 0.5mm, IPC Medium Density)
footprint TQFP100_L (Thin QFP, 100-Leads, Body 14x14mm, Pitch 0.5mm, IPC High Density)
footprint TQFP100_M (Thin QFP, 100-Leads, Body 14x14mm, Pitch 0.5mm, IPC Low Density)
3D model 1032-TQFP100 (100-Pin Thin Quad Flat Pack (TQFP100))
pins: 1 NC, 2 NC, 3 I/O57 (io), 4 I/O58 (io), 5 I/O59 (io), 6 I/O60 (io), 7 I/O61 (io), 8 I/O62 (io), 9 I/O63 (io), 10 IN7 (in), 11 Y0 (in), 12 VCC (power), 13 GND (power), 14 ~{ispEN} (in), 15 ~{RESET} (in), 16 SDI/IN0 (in), 17 I/O0 (io), 18 I/O1 (io), 19 I/O2 (io), 20 I/O3 (io), 21 I/O4 (io), 22 I/O5 (io), 23 I/O6 (io), 24 NC, 25 NC, 26 NC, 27 NC, 28 I/O7 (io), 29 I/O8 (io), 30 I/O9 (io), 31 I/O10 (io), 32 I/O11 (io), 33 I/O12 (io), 34 I/O13 (io), 35 I/O14 (io), 36 I/O15 (io), 37 MODE/IN1 (in), 38 GND (power), 39 SDO/IN2 (io), 40 I/O16 (io), 41 I/O17 (io), 42 I/O18 (io), 43 I/O19 (io), 44 I/O20 (io), 45 I/O21 (io), 46 I/O22 (io), 47 I/O23 (io), 48 I/O24 (io), 49 NC, 50 NC, 51 NC, 52 NC, 53 I/O25 (io), 54 I/O26 (io), 55 I/O27 (io), 56 I/O28 (io), 57 I/O29 (io), 58 I/O30 (io), 59 I/O31 (io), 60 SCLK/IN3 (in), 61 Y3 (in), 62 Y2 (in), 63 GND (power), 64 VCC (power), 65 Y1 (in), 66 IN4 (in), 67 I/O32 (io), 68 I/O33 (io), 69 I/O34 (io), 70 I/O35 (io), 71 I/O36 (io), 72 I/O37 (io), 73 I/O38 (io), 74 NC, 75 NC, 76 NC, 77 NC, 78 I/O39 (io), 79 I/O40 (io), 80 I/O41 (io), 81 I/O42 (io), 82 I/O43 (io), 83 I/O44 (io), 84 I/O45 (io), 85 I/O46 (io), 86 I/O47 (io), 87 IN5 (in), 88 GND (power), 89 IN6 (in), 90 I/O48 (io), 91 I/O49 (io), 92 I/O50 (io), 93 I/O51 (io), 94 I/O52 (io), 95 I/O53 (io), 96 I/O54 (io), 97 I/O55 (io), 98 I/O56 (io), 99 NC, 100 NC

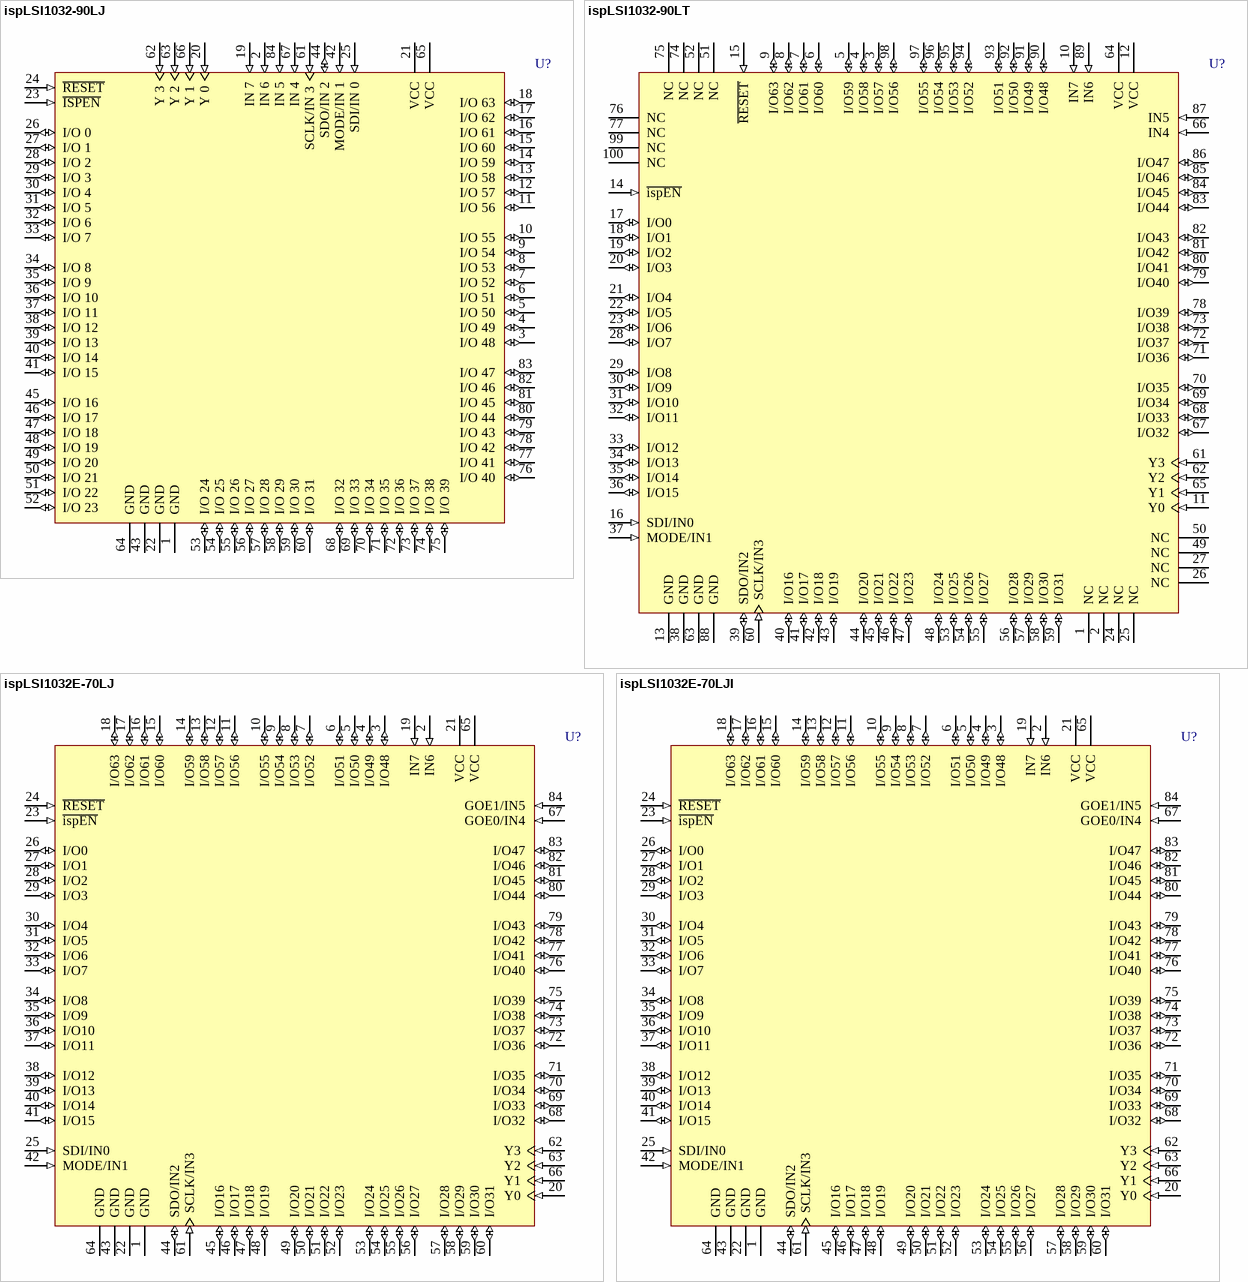
[diagram p8: symbols ispLSI1032-90LJ to ispLSI1032E-70LJI]

## ispLSI1032-90LJ
designator U?
High-Density Programmable Logic; Published: 8-Jun-2000; LatestRevisionDate: 13-Apr-2006; LatestRevisionNote: IPC-7351 Footprint Added.; DatasheetVersion: 1994; PackageVersion: pkg_32, Aug-2005; PackageReference: PLCC84; Publisher: Altium Limited; PackageDescription: 84-Pin Leaded Chip Carrier 1.27 mm Pitch; Code_IPC: PLCC-84; ComponentLink1Description: Manufacturer Link; ComponentLink1URL: http://www.latticesemi.com/products/mature/index.cfm; ComponentLink2Description: Datasheet; ComponentLink2URL: http://www.latticesemi.com/lit/docs/datasheets/cpld/1032.pdf
footprint PLCC84_N (Leaded Chip Carrier, 84-Leads, Body 29.3x29.3mm, Pitch 1.27mm, IPC Medium Density)
footprint PLCC84_L (Leaded Chip Carrier, 84-Leads, Body 29.3x29.3mm, Pitch 1.27mm, IPC High Density)
footprint PLCC84_M (Leaded Chip Carrier, 84-Leads, Body 29.3x29.3mm, Pitch 1.27mm, IPC Low Density)
3D model 1032-PLCC84 (84-Pin Leaded Chip Carrier 1.27 mm Pitch)
pins: 1 GND (power), 2 IN 6 (in), 3 I/O 48 (io), 4 I/O 49 (io), 5 I/O 50 (io), 6 I/O 51 (io), 7 I/O 52 (io), 8 I/O 53 (io), 9 I/O 54 (io), 10 I/O 55 (io), 11 I/O 56 (io), 12 I/O 57 (io), 13 I/O 58 (io), 14 I/O 59 (io), 15 I/O 60 (io), 16 I/O 61 (io), 17 I/O 62 (io), 18 I/O 63 (io), 19 IN 7 (in), 20 Y 0 (in), 21 VCC (power), 22 GND (power), 23 ~{ISPEN} (in), 24 ~{RESET} (in), 25 SDI/IN 0 (in), 26 I/O 0 (io), 27 I/O 1 (io), 28 I/O 2 (io), 29 I/O 3 (io), 30 I/O 4 (io), 31 I/O 5 (io), 32 I/O 6 (io), 33 I/O 7 (io), 34 I/O 8 (io), 35 I/O 9 (io), 36 I/O 10 (io), 37 I/O 11 (io), 38 I/O 12 (io), 39 I/O 13 (io), 40 I/O 14 (io), 41 I/O 15 (io), 42 MODE/IN 1 (in), 43 GND (power), 44 SDO/IN 2 (io), 45 I/O 16 (io), 46 I/O 17 (io), 47 I/O 18 (io), 48 I/O 19 (io), 49 I/O 20 (io), 50 I/O 21 (io), 51 I/O 22 (io), 52 I/O 23 (io), 53 I/O 24 (io), 54 I/O 25 (io), 55 I/O 26 (io), 56 I/O 27 (io), 57 I/O 28 (io), 58 I/O 29 (io), 59 I/O 30 (io), 60 I/O 31 (io), 61 SCLK/IN 3 (in), 62 Y 3 (in), 63 Y 2 (in), 64 GND (power), 65 VCC (power), 66 Y 1 (in), 67 IN 4 (in), 68 I/O 32 (io), 69 I/O 33 (io), 70 I/O 34 (io), 71 I/O 35 (io), 72 I/O 36 (io), 73 I/O 37 (io), 74 I/O 38 (io), 75 I/O 39 (io), 76 I/O 40 (io), 77 I/O 41 (io), 78 I/O 42 (io), 79 I/O 43 (io), 80 I/O 44 (io), 81 I/O 45 (io), 82 I/O 46 (io), 83 I/O 47 (io), 84 IN 5 (in)

## ispLSI1032-90LT
designator U?
High-Density Programmable Logic; Note: Pins 1, 2, 24-27, 49-52, 74-77, 99 and 100 are No internal Connection (NC) pins.; Published: 8-Jun-2000; LatestRevisionDate: 13-Apr-2006; LatestRevisionNote: IPC-7351 Footprint Added.; DatasheetVersion: 1994; PackageVersion: pkg_32, Aug-2005; PackageReference: TQFP100; Publisher: Altium Limited; PackageDescription: 100-Pin Thin Quad Flat Pack (TQFP100); Code_JEDEC: MS-026-BED; ComponentLink1Description: Manufacturer Link; ComponentLink1URL: http://www.latticesemi.com/products/mature/index.cfm; ComponentLink2Description: Datasheet; ComponentLink2URL: http://www.latticesemi.com/lit/docs/datasheets/cpld/1032.pdf
footprint TQFP100_N (Thin QFP, 100-Leads, Body 14x14mm, Pitch 0.5mm, IPC Medium Density)
footprint TQFP100_L (Thin QFP, 100-Leads, Body 14x14mm, Pitch 0.5mm, IPC High Density)
footprint TQFP100_M (Thin QFP, 100-Leads, Body 14x14mm, Pitch 0.5mm, IPC Low Density)
3D model 1032-TQFP100 (100-Pin Thin Quad Flat Pack (TQFP100))
pins: 1 NC, 2 NC, 3 I/O57 (io), 4 I/O58 (io), 5 I/O59 (io), 6 I/O60 (io), 7 I/O61 (io), 8 I/O62 (io), 9 I/O63 (io), 10 IN7 (in), 11 Y0 (in), 12 VCC (power), 13 GND (power), 14 ~{ispEN} (in), 15 ~{RESET} (in), 16 SDI/IN0 (in), 17 I/O0 (io), 18 I/O1 (io), 19 I/O2 (io), 20 I/O3 (io), 21 I/O4 (io), 22 I/O5 (io), 23 I/O6 (io), 24 NC, 25 NC, 26 NC, 27 NC, 28 I/O7 (io), 29 I/O8 (io), 30 I/O9 (io), 31 I/O10 (io), 32 I/O11 (io), 33 I/O12 (io), 34 I/O13 (io), 35 I/O14 (io), 36 I/O15 (io), 37 MODE/IN1 (in), 38 GND (power), 39 SDO/IN2 (io), 40 I/O16 (io), 41 I/O17 (io), 42 I/O18 (io), 43 I/O19 (io), 44 I/O20 (io), 45 I/O21 (io), 46 I/O22 (io), 47 I/O23 (io), 48 I/O24 (io), 49 NC, 50 NC, 51 NC, 52 NC, 53 I/O25 (io), 54 I/O26 (io), 55 I/O27 (io), 56 I/O28 (io), 57 I/O29 (io), 58 I/O30 (io), 59 I/O31 (io), 60 SCLK/IN3 (in), 61 Y3 (in), 62 Y2 (in), 63 GND (power), 64 VCC (power), 65 Y1 (in), 66 IN4 (in), 67 I/O32 (io), 68 I/O33 (io), 69 I/O34 (io), 70 I/O35 (io), 71 I/O36 (io), 72 I/O37 (io), 73 I/O38 (io), 74 NC, 75 NC, 76 NC, 77 NC, 78 I/O39 (io), 79 I/O40 (io), 80 I/O41 (io), 81 I/O42 (io), 82 I/O43 (io), 83 I/O44 (io), 84 I/O45 (io), 85 I/O46 (io), 86 I/O47 (io), 87 IN5 (in), 88 GND (power), 89 IN6 (in), 90 I/O48 (io), 91 I/O49 (io), 92 I/O50 (io), 93 I/O51 (io), 94 I/O52 (io), 95 I/O53 (io), 96 I/O54 (io), 97 I/O55 (io), 98 I/O56 (io), 99 NC, 100 NC

## ispLSI1032E-70LJ
designator U?
In-System Programmable High-Density PLD; Note: Pins 25, 42, 44, 61, 67 & 84 have dual function capability; Pins 67 & 84 are software selectable.; Published: 23-Sep-2002; LatestRevisionDate: 13-Apr-2006; LatestRevisionNote: IPC-7351 Footprint Added.; DatasheetVersion: Oct-1998; PackageVersion: pkg_32, Aug-2005; PackageReference: PLCC84; Publisher: Altium Limited; PackageDescription: 84-Pin Leaded Chip Carrier 1.27 mm Pitch; Code_IPC: PLCC-84; ComponentLink1Description: Manufacturer Link; ComponentLink1URL: http://www.latticesemi.com/products/mature/index.cfm; ComponentLink2Description: Datasheet; ComponentLink2URL: http://www.latticesemi.com/lit/docs/datasheets/cpld/1032e.pdf
footprint PLCC84_N (Leaded Chip Carrier, 84-Leads, Body 29.3x29.3mm, Pitch 1.27mm, IPC Medium Density)
footprint PLCC84_L (Leaded Chip Carrier, 84-Leads, Body 29.3x29.3mm, Pitch 1.27mm, IPC High Density)
footprint PLCC84_M (Leaded Chip Carrier, 84-Leads, Body 29.3x29.3mm, Pitch 1.27mm, IPC Low Density)
3D model 1032E-PLCC84 (84-Pin Leaded Chip Carrier 1.27 mm Pitch)
pins: 1 GND (power), 2 IN6 (in), 3 I/O48 (io), 4 I/O49 (io), 5 I/O50 (io), 6 I/O51 (io), 7 I/O52 (io), 8 I/O53 (io), 9 I/O54 (io), 10 I/O55 (io), 11 I/O56 (io), 12 I/O57 (io), 13 I/O58 (io), 14 I/O59 (io), 15 I/O60 (io), 16 I/O61 (io), 17 I/O62 (io), 18 I/O63 (io), 19 IN7 (in), 20 Y0 (in), 21 VCC (power), 22 GND (power), 23 ~{isp}~{EN} (in), 24 ~{RESET} (in), 25 SDI/IN0 (in), 26 I/O0 (io), 27 I/O1 (io), 28 I/O2 (io), 29 I/O3 (io), 30 I/O4 (io), 31 I/O5 (io), 32 I/O6 (io), 33 I/O7 (io), 34 I/O8 (io), 35 I/O9 (io), 36 I/O10 (io), 37 I/O11 (io), 38 I/O12 (io), 39 I/O13 (io), 40 I/O14 (io), 41 I/O15 (io), 42 MODE/IN1 (in), 43 GND (power), 44 SDO/IN2 (io), 45 I/O16 (io), 46 I/O17 (io), 47 I/O18 (io), 48 I/O19 (io), 49 I/O20 (io), 50 I/O21 (io), 51 I/O22 (io), 52 I/O23 (io), 53 I/O24 (io), 54 I/O25 (io), 55 I/O26 (io), 56 I/O27 (io), 57 I/O28 (io), 58 I/O29 (io), 59 I/O30 (io), 60 I/O31 (io), 61 SCLK/IN3 (in), 62 Y3 (in), 63 Y2 (in), 64 GND (power), 65 VCC (power), 66 Y1 (in), 67 GOE0/IN4 (in), 68 I/O32 (io), 69 I/O33 (io), 70 I/O34 (io), 71 I/O35 (io), 72 I/O36 (io), 73 I/O37 (io), 74 I/O38 (io), 75 I/O39 (io), 76 I/O40 (io), 77 I/O41 (io), 78 I/O42 (io), 79 I/O43 (io), 80 I/O44 (io), 81 I/O45 (io), 82 I/O46 (io), 83 I/O47 (io), 84 GOE1/IN5 (in)

## ispLSI1032E-70LJI
designator U?
In-System Programmable High-Density PLD; Note: Pins 25, 42, 44, 61, 67 & 84 have dual function capability; Pins 67 & 84 are software selectable.; Published: 23-Sep-2002; LatestRevisionDate: 13-Apr-2006; LatestRevisionNote: IPC-7351 Footprint Added.; DatasheetVersion: Oct-1998; PackageVersion: pkg_32, Aug-2005; PackageReference: PLCC84; Publisher: Altium Limited; PackageDescription: 84-Pin Leaded Chip Carrier 1.27 mm Pitch; Code_IPC: PLCC-84; ComponentLink1Description: Manufacturer Link; ComponentLink1URL: http://www.latticesemi.com/products/mature/index.cfm; ComponentLink2Description: Datasheet; ComponentLink2URL: http://www.latticesemi.com/lit/docs/datasheets/cpld/1032e.pdf
footprint PLCC84_N (Leaded Chip Carrier, 84-Leads, Body 29.3x29.3mm, Pitch 1.27mm, IPC Medium Density)
footprint PLCC84_L (Leaded Chip Carrier, 84-Leads, Body 29.3x29.3mm, Pitch 1.27mm, IPC High Density)
footprint PLCC84_M (Leaded Chip Carrier, 84-Leads, Body 29.3x29.3mm, Pitch 1.27mm, IPC Low Density)
3D model 1032E-PLCC84 (84-Pin Leaded Chip Carrier 1.27 mm Pitch)
pins: 1 GND (power), 2 IN6 (in), 3 I/O48 (io), 4 I/O49 (io), 5 I/O50 (io), 6 I/O51 (io), 7 I/O52 (io), 8 I/O53 (io), 9 I/O54 (io), 10 I/O55 (io), 11 I/O56 (io), 12 I/O57 (io), 13 I/O58 (io), 14 I/O59 (io), 15 I/O60 (io), 16 I/O61 (io), 17 I/O62 (io), 18 I/O63 (io), 19 IN7 (in), 20 Y0 (in), 21 VCC (power), 22 GND (power), 23 ~{isp}~{EN} (in), 24 ~{RESET} (in), 25 SDI/IN0 (in), 26 I/O0 (io), 27 I/O1 (io), 28 I/O2 (io), 29 I/O3 (io), 30 I/O4 (io), 31 I/O5 (io), 32 I/O6 (io), 33 I/O7 (io), 34 I/O8 (io), 35 I/O9 (io), 36 I/O10 (io), 37 I/O11 (io), 38 I/O12 (io), 39 I/O13 (io), 40 I/O14 (io), 41 I/O15 (io), 42 MODE/IN1 (in), 43 GND (power), 44 SDO/IN2 (io), 45 I/O16 (io), 46 I/O17 (io), 47 I/O18 (io), 48 I/O19 (io), 49 I/O20 (io), 50 I/O21 (io), 51 I/O22 (io), 52 I/O23 (io), 53 I/O24 (io), 54 I/O25 (io), 55 I/O26 (io), 56 I/O27 (io), 57 I/O28 (io), 58 I/O29 (io), 59 I/O30 (io), 60 I/O31 (io), 61 SCLK/IN3 (in), 62 Y3 (in), 63 Y2 (in), 64 GND (power), 65 VCC (power), 66 Y1 (in), 67 GOE0/IN4 (in), 68 I/O32 (io), 69 I/O33 (io), 70 I/O34 (io), 71 I/O35 (io), 72 I/O36 (io), 73 I/O37 (io), 74 I/O38 (io), 75 I/O39 (io), 76 I/O40 (io), 77 I/O41 (io), 78 I/O42 (io), 79 I/O43 (io), 80 I/O44 (io), 81 I/O45 (io), 82 I/O46 (io), 83 I/O47 (io), 84 GOE1/IN5 (in)